# Altium footprint library Integrados.PcbLib: 96 footprints (part 5 of 6)
Each footprint in its own frame and in the unit in brackets; x right, y up, seen from the top. Pads: shape width x height; smd on the part's side, far side on the other; paste and mask are expansions set on the pad; w line width, h text height; cw(c..) or ccw(c..) is an arc to the next point about the centre after c.
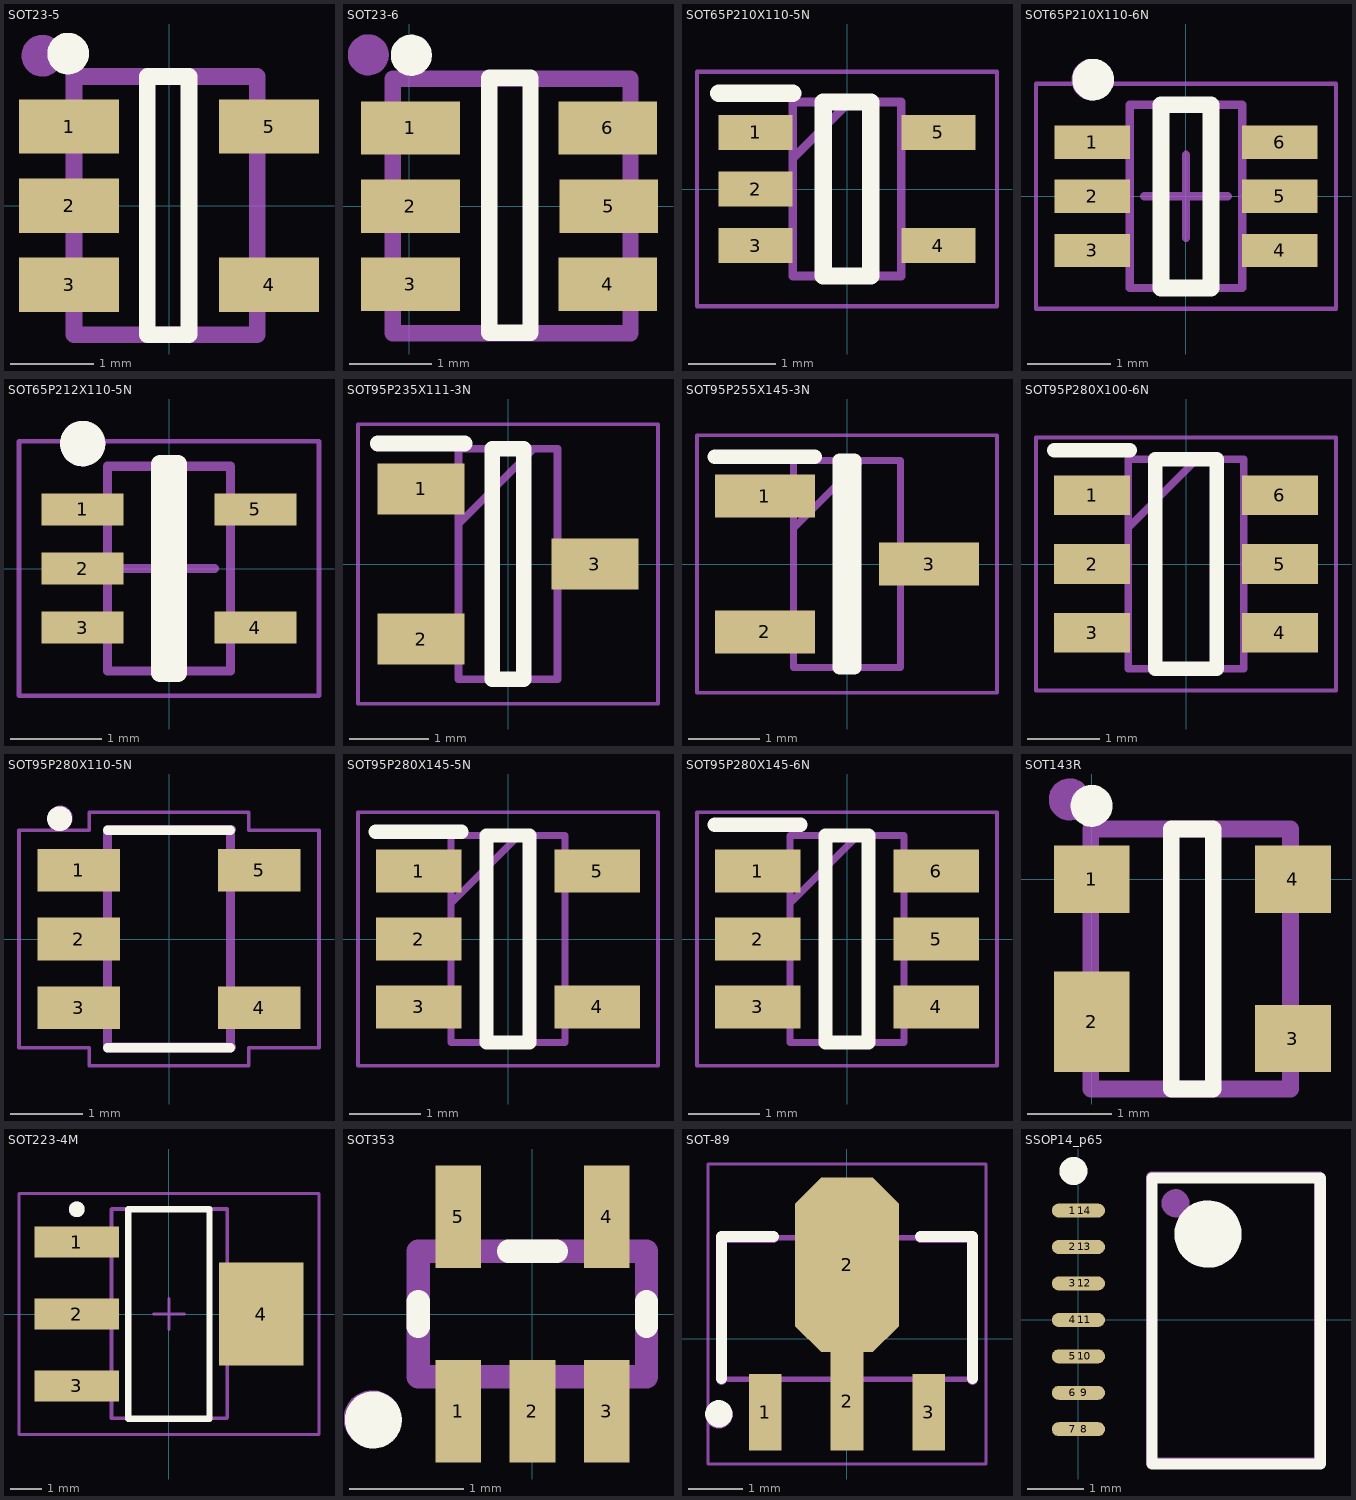
[diagram p4: the footprints below, top view; thin cyan lines are the x and y axes]

## SOT23-5 [mm]
pads (5):
  rect 1.2x0.65 smd: 1(-1.2,0.95) 2(-1.2,0) 3(-1.2,-0.95) 4(1.2,-0.95) 5(1.2,0.95)
Top Overlay:
  circle w0.25: c-1.21,1.825 r0.125
  lines w0.2: -0.26,-1.55 0.24,-1.55 0.24,1.55 -0.26,1.55 -0.26,-1.55
Mechanical 29:
  circle w0.25: c-1.52,1.8 r0.125
  lines w0.2: -1.14,-1.55 -1.14,1.55 1.06,1.55 1.06,-1.55 -1.14,-1.55
  text "'.Designator'" at -0.26,1.37 h0.5
3D body "SOT23-5.step": height 1, standoff 0, extent -1.227,-1.462 1.113,1.458

## SOT23-6 [mm]
pads (6):
  rect 1.2x0.65 smd: 1(0.014,0.95) 2(0.014,0) 3(0.014,-0.95) 4(2.414,-0.95) 5(2.425,0) 6(2.414,0.95)
Top Overlay:
  circle w0.25: c0.024,1.835 r0.125
  lines w0.2: 0.974,-1.54 0.974,1.56 1.474,1.56 1.474,-1.54 0.974,-1.54
Mechanical 29:
  circle w0.25: c-0.5,1.84 r0.125
  lines w0.2: -0.2,-1.55 2.69,-1.55 2.69,1.55 -0.2,1.55 -0.2,-1.55
  text "'.Designator'" at 0.951,1.392 h0.5
3D body "SOT23-6.step": height 1.3, standoff 0, extent -0.255,-1.5 2.745,1.5

## SOT65P210X110-5N [mm]
pads (5):
  rect 0.85x0.4 smd: 1(-1.05,0.65) 2(-1.05,0) 3(-1.05,-0.65) 4(1.05,-0.65) 5(1.05,0.65)
Top Overlay:
  lines w0.2: -1.475,1.1 -0.625,1.1 ; -0.275,-1 0.275,-1 0.275,1 -0.275,1 -0.275,-1
Mechanical 13:
  lines w0.1: -0.625,0.35 0.025,1 ; -0.625,-1 0.625,-1 0.625,1 -0.625,1 -0.625,-1
Mechanical 15:
  lines w0.05: -1.725,-1.35 1.725,-1.35 1.725,1.35 -1.725,1.35 -1.725,-1.35
3D body "NCP612SQ30T2G.stp": height 1.1, standoff 0, extent -1.05,-1 1.05,1

## SOT65P210X110-6N [mm] "SOT23, 6-Leads, Body 2,00x2,10mm, Pitch 0,65mm, IPC Medium Density"
height 1.1
pads (6):
  rect 0.9x0.4 smd: 1(-1.125,0.65) 2(-1.125,0) 3(-1.125,-0.65) 4(1.125,-0.65) 5(1.125,0) 6(1.125,0.65)
Top Overlay:
  circle w0.25: c-1.115,1.4 r0.125
  lines w0.2: -0.3,-1.1 -0.3,1.1 0.3,1.1 0.3,-1.1 -0.3,-1.1
Mechanical 15:
  lines w0.05: -1.8,-1.35 1.8,-1.35 1.8,1.35 -1.8,1.35 -1.8,-1.35
  lines w0.1: -0.5,0 0.5,0 ; 0,-0.5 0,0.5
Mechanical 29:
  circle w0.25: c-1.125,1.4 r0.125
  lines w0.1: -0.675,-1.1 0.675,-1.1 0.675,1.1 -0.675,1.1 -0.675,-1.1
  text "'.Designator'" at -0.12,0.95 h0.5
3D body "SOT65P210X110-6N.step": height 1.1, standoff 0, extent -1.3,-1.1 1.3,1.1

## SOT65P212X110-5N [mm] "SOT23, 5-Leads, Body 2,05x2,13mm, Pitch 0,65mm, IPC Medium Density"
height 1.1
pads (5):
  rect 0.9x0.35 smd: 1(-0.95,0.65) 2(-0.95,0) 3(-0.95,-0.65) 4(0.95,-0.65) 5(0.95,0.65)
Top Overlay:
  circle w0.25: c-0.95,1.375 r0.125
  lines w0.2: -0.1,-1.15 0.1,-1.15 0.1,1.15 -0.1,1.15 -0.1,-1.15
Mechanical 15:
  lines w0.05: -1.65,-1.4 -1.65,1.4 1.65,1.4 1.65,-1.4 -1.65,-1.4
  lines w0.1: -0.5,0 0.5,0 ; 0,-0.5 0,0.5
Mechanical 29:
  circle w0.25: c-0.95,1.375 r0.125
  lines w0.1: -0.675,-1.125 -0.675,1.125 0.675,1.125 0.675,-1.125 -0.675,-1.125
  text "'.Designator'" at -0.26,0.96 h0.5
Mechanical 30:
  text "'.Designator'" at -0.26,0.96 h0.5
3D body "SOT65P212X110-5N.stp": height 0.74, standoff -0.02, extent -1.23,-1.05 1.27,1.05

## SOT95P235X111-3N [mm]
pads (3):
  rect 1.1x0.65 smd: 1(-1.1,0.95) 2(-1.1,-0.95) 3(1.1,0)
Top Overlay:
  lines w0.2: -1.65,1.525 -0.55,1.525 ; -0.2,-1.46 -0.2,1.46 0.2,1.46 0.2,-1.46 -0.2,-1.46
Mechanical 13:
  lines w0.1: -0.625,0.51 0.325,1.46 ; -0.625,-1.46 -0.625,1.46 0.625,1.46 0.625,-1.46 -0.625,-1.46
Mechanical 15:
  lines w0.05: -1.9,-1.77 -1.9,1.77 1.9,1.77 1.9,-1.77 -1.9,-1.77
3D body "LM4040CYM3-2.5-TR.stp": height 1.11, standoff 0, extent -1.175,-1.46 1.175,1.46

## SOT95P255X145-3N [mm]
pads (3):
  rect 1.4x0.6 smd: 1(-1.15,0.95) 2(-1.15,-0.95) 3(1.15,0)
Top Overlay:
  lines w0.2: -1.85,1.5 -0.45,1.5 ; -0.1,-1.45 -0.1,1.45 0.1,1.45 0.1,-1.45 -0.1,-1.45
Mechanical 13:
  lines w0.1: -0.75,0.5 0.2,1.45 ; -0.75,-1.45 -0.75,1.45 0.75,1.45 0.75,-1.45 -0.75,-1.45
Mechanical 15:
  lines w0.05: -2.1,-1.8 -2.1,1.8 2.1,1.8 2.1,-1.8 -2.1,-1.8
3D body "TC54VC3002ECB713.stp": height 1.45, standoff 0, extent -1.275,-1.45 1.275,1.45

## SOT95P280X100-6N [mm]
pads (6):
  rect 1.05x0.55 smd: 1(-1.3,0.95) 2(-1.3,0) 3(-1.3,-0.95) 4(1.3,-0.95) 5(1.3,0) 6(1.3,0.95)
Top Overlay:
  lines w0.2: -1.825,1.575 -0.775,1.575 ; -0.425,-1.45 -0.425,1.45 0.425,1.45 0.425,-1.45 -0.425,-1.45
Mechanical 13:
  lines w0.1: -0.8,0.5 0.15,1.45 ; -0.8,-1.45 -0.8,1.45 0.8,1.45 0.8,-1.45 -0.8,-1.45
Mechanical 15:
  lines w0.05: -2.075,-1.75 -2.075,1.75 2.075,1.75 2.075,-1.75 -2.075,-1.75
3D body "AP63205WU-7.stp": height 1, standoff 0, extent -1.4,-1.45 1.4,1.45

## SOT95P280X110-5N [mm]
pads (5):
  rect 1.14x0.59 smd: 1(-1.245,0.95) 2(-1.245,0) 3(-1.245,-0.95) 4(1.245,-0.95) 5(1.245,0.95)
Top Overlay:
  circle w0.2: c-1.51,1.66 r0.071
  lines w0.127: -0.85,-1.5 0.85,-1.5 ; -0.85,1.5 0.85,1.5
Mechanical 4:
  lines w0.127: -0.85,-1.5 0.85,-1.5 ; -0.85,-1.5 -0.85,1.5 ; -0.85,-1.5 0.85,-1.5 ; -0.85,-1.5 -0.85,1.5 ; -0.85,1.5 0.85,1.5 ; -0.85,1.5 0.85,1.5 ; 0.85,-1.5 0.85,1.5 ; 0.85,-1.5 0.85,1.5
Mechanical 16:
  lines w0.05: -2.07,-1.5 -1.1,-1.5 -1.1,-1.75 1.1,-1.75 1.1,-1.5 2.07,-1.5 2.07,1.5 1.1,1.5 1.1,1.75 -1.1,1.75 -1.1,1.5 -2.07,1.5 -2.07,-1.5
Mechanical 29:
  circle w0.2: c-1.5,1.67 r0.071
  lines w0.127: -0.84,-1.49 0.86,-1.49 ; -0.84,1.51 0.86,1.51
  text "'.Designator'" at -0.04,0.39 h0.5
Mechanical 30:
  circle w0.2: c-1.51,1.66 r0.071
  lines w0.127: -0.85,-1.5 0.85,-1.5 ; -0.85,1.5 0.85,1.5
  text "'.Designator'" at -0.04,0.39 h0.5
3D body "SOT23-5.step": height 1, standoff 0, extent -1.22,-1.45 1.12,1.47

## SOT95P280X145-5N [mm]
pads (5):
  rect 1.2x0.6 smd: 1(-1.25,0.95) 2(-1.25,0) 3(-1.25,-0.95) 4(1.25,-0.95) 5(1.25,0.95)
Top Overlay:
  lines w0.2: -1.85,1.5 -0.65,1.5 ; -0.3,-1.45 -0.3,1.45 0.3,1.45 0.3,-1.45 -0.3,-1.45
Mechanical 20:
  lines w0.05: -2.1,-1.775 -2.1,1.775 2.1,1.775 2.1,-1.775 -2.1,-1.775
Mechanical 29:
  lines w0.1: -0.8,0.5 0.15,1.45 ; -0.8,-1.45 0.8,-1.45 0.8,1.45 -0.8,1.45 -0.8,-1.45
  text "'.Designator'" at -0.04,0.38 h0.5
Mechanical 30:
  lines w0.1: -0.8,0.5 0.15,1.45 ; -0.8,-1.45 0.8,-1.45 0.8,1.45 -0.8,1.45 -0.8,-1.45
  text "'.Designator'" at -0.04,0.36 h0.5
3D body "SOT23-5.step": height 1, standoff 0, extent -1.15,-1.48 1.19,1.44

## SOT95P280X145-6N [mm]
pads (6):
  rect 1.2x0.6 smd: 1(-1.25,0.95) 2(-1.25,0) 3(-1.25,-0.95) 4(1.25,-0.95) 5(1.25,0) 6(1.25,0.95)
Top Overlay:
  lines w0.2: -1.85,1.6 -0.65,1.6 ; -0.3,-1.45 -0.3,1.45 0.3,1.45 0.3,-1.45 -0.3,-1.45
Mechanical 20:
  lines w0.05: -2.1,-1.775 -2.1,1.775 2.1,1.775 2.1,-1.775 -2.1,-1.775
Mechanical 29:
  lines w0.1: -0.8,0.5 0.15,1.45 ; -0.8,-1.45 -0.8,1.45 0.8,1.45 0.8,-1.45 -0.8,-1.45
  text "'.Designator'" at -0.14,0.73 h0.5
3D body "User Library-TSOP-6.step": height 0.9, standoff -0.1, extent -1.32,-1.5 1.38,1.5

## SOT143R [mm]
pads (4):
  rect 0.9x0.8 smd: 1(0,0) 3(2.4,-1.9) 4(2.4,0)
  rect 0.9x1.2 smd: 2(0,-1.7)
Top Overlay:
  circle w0.25: c0,0.875 r0.125
  lines w0.2: 0.95,-2.5 0.95,0.6 1.45,0.6 1.45,-2.5 0.95,-2.5
Mechanical 29:
  circle w0.25: c-0.26,0.95 r0.125
  lines w0.2: -0.01,-2.5 2.37,-2.5 2.37,0.6 -0.01,0.6 -0.01,-2.5
  text "'.Designator'" at 0.9,0.37 h0.5
3D body "SOT143R.STEP": height 0.95, standoff 0.02, extent -0.07,-2.39 2.43,0.51

## SOT223-4M [mm] "SOT223, 4-Leads, Body 6.5x3.5mm, Pitch 2.3mm, Lead Span 7mm, IPC Low Density"
height 1.8
pads (4):
  rect 2.7x1 smd: 1(-2.95,2.3) 2(-2.95,0) 3(-2.95,-2.3)
  rect 2.7x3.3 smd: 4(2.95,0)
Top Overlay:
  circle w0.25: c-2.95,3.35 r0.125
  lines w0.2: -1.3,-3.35 1.3,-3.35 1.3,3.35 -1.3,3.35 -1.3,-3.35
Mechanical 13:
  lines w0.1: -1.83,-3.33 -1.83,3.37 1.87,3.37 1.87,-3.33 -1.83,-3.33
Mechanical 15:
  lines w0.1: -0.5,0 0.5,0 ; 0,-0.5 0,0.5 ; -4.8,-3.85 4.8,-3.85 4.8,3.85 -4.8,3.85 -4.8,-3.85
Mechanical 29:
  circle w0.25: c-2.95,3.35 r0.125
  lines w0.1: -1.85,-3.35 1.85,-3.35 1.85,3.35 -1.85,3.35 -1.85,-3.35
  text "'.Designator'" at -0.04,0.37 h0.5
3D body "SOT-223-1.step": height 1.64, standoff -0.01, extent -3.348,-3.251 3.652,3.249

## SOT353 [mil]
pads (5):
  rect 15.75x35.43 smd: 1(-25.59,-33.5) 2(0,-33.5) 3(25.59,-33.5) 4(25.59,33.5) 5(-25.59,33.5)
Top Overlay:
  circle w9.84: c-54.85,-36.54 r4.92
  lines w8: -39.37,-4.33 -39.37,4.33 ; -8.27,21.65 8.27,21.65 ; 39.37,-4.33 39.37,4.33
Mechanical 29:
  circle w9.84: c-55.24,-36.15 r4.92
  lines w8: -39.37,-21.65 39.37,-21.65 39.37,21.65 -39.37,21.65 -39.37,-21.65
  text "'.Designator'" at -30.71,-11.02 h19.68
3D body "SOT353-1.step": height 43.31, standoff 0, extent -43.3,-46.24 43.31,48.25

## SOT-89 [mm]
pads (4):
  rect 0.6x1.4 smd: 1(-1.5,-1.35) 3(1.5,-1.35)
  rect 0.6x1.8 smd: 2(0,-1.15)
  oct 1.9x3.2 smd: 2(0,1.35)
Top Overlay:
  circle w0.25: c-2.35,-1.38 r0.125
  lines w0.2: -2.3,-0.73 -2.3,1.87 -1.35,1.87 ; 1.35,1.87 2.3,1.87 2.3,-0.73
Mechanical 13:
  lines w0.1: -2.3,-0.75 -2.3,1.85 2.3,1.85 2.3,-0.75 -2.3,-0.75
Mechanical 15:
  lines w0.05: -2.55,-2.3 -2.55,3.2 2.55,3.2 2.55,-2.3 -2.55,-2.3
  lines w0.1: -0.5,0.55 0.5,0.55 ; 0,0.05 0,1.05
Mechanical 29:
  circle w0.25: c-2.35,-1.4 r0.125
  lines w0.2: -2.3,-0.75 -2.3,1.85 -1.35,1.85 ; 1.35,1.85 2.3,1.85 2.3,-0.75
  text "'.Designator'" at -0.263,0.51 h0.5
3D body "SOT-89.step": height 1.5, standoff 0, extent -2.224,-1.598 2.276,2.402

## SSOP14_p65 [mm] "pitch 0.65mm"
pads (14):
  oval 0.75x0.25 smd: 1(-0.1,1.95) 2(-0.1,1.3) 3(-0.1,0.65) 4(-0.1,0) 5(-0.1,-0.65) 6(-0.1,-1.3) 7(-0.1,-1.95) 8(0.1,-1.95) 9(0.1,-1.3) 10(0.1,-0.65) 11(0.1,0) 12(0.1,0.65) 13(0.1,1.3) 14(0.1,1.95)
Top Overlay:
  circle w0.6: c2.31,1.53 r0.3
  circle w0.25: c-0.09,2.655 r0.125
  lines w0.2: 1.31,-2.57 4.31,-2.57 4.31,2.53 1.31,2.53 1.31,-2.57
Mechanical 29:
  circle w0.25: c1.73,2.08 r0.125
  lines w0.2: 1.3,-2.55 1.3,2.55 4.3,2.55 4.3,-2.55 1.3,-2.55
  text "'.Designator'" at 3.069,-2.222 h0.5
3D body "TSSOP14.step": height 1.1, standoff 0, extent -0.379,-2.491 6.021,2.509